# Altium footprint library PCBLIB.PcbLib: 775 footprints (part 32 of 49)
Each footprint in its own frame and in the unit in brackets; x right, y up, seen from the top. Pads: shape width x height; smd on the part's side, far side on the other; paste and mask are expansions set on the pad; w line width, h text height; cw(c..) or ccw(c..) is an arc to the next point about the centre after c.
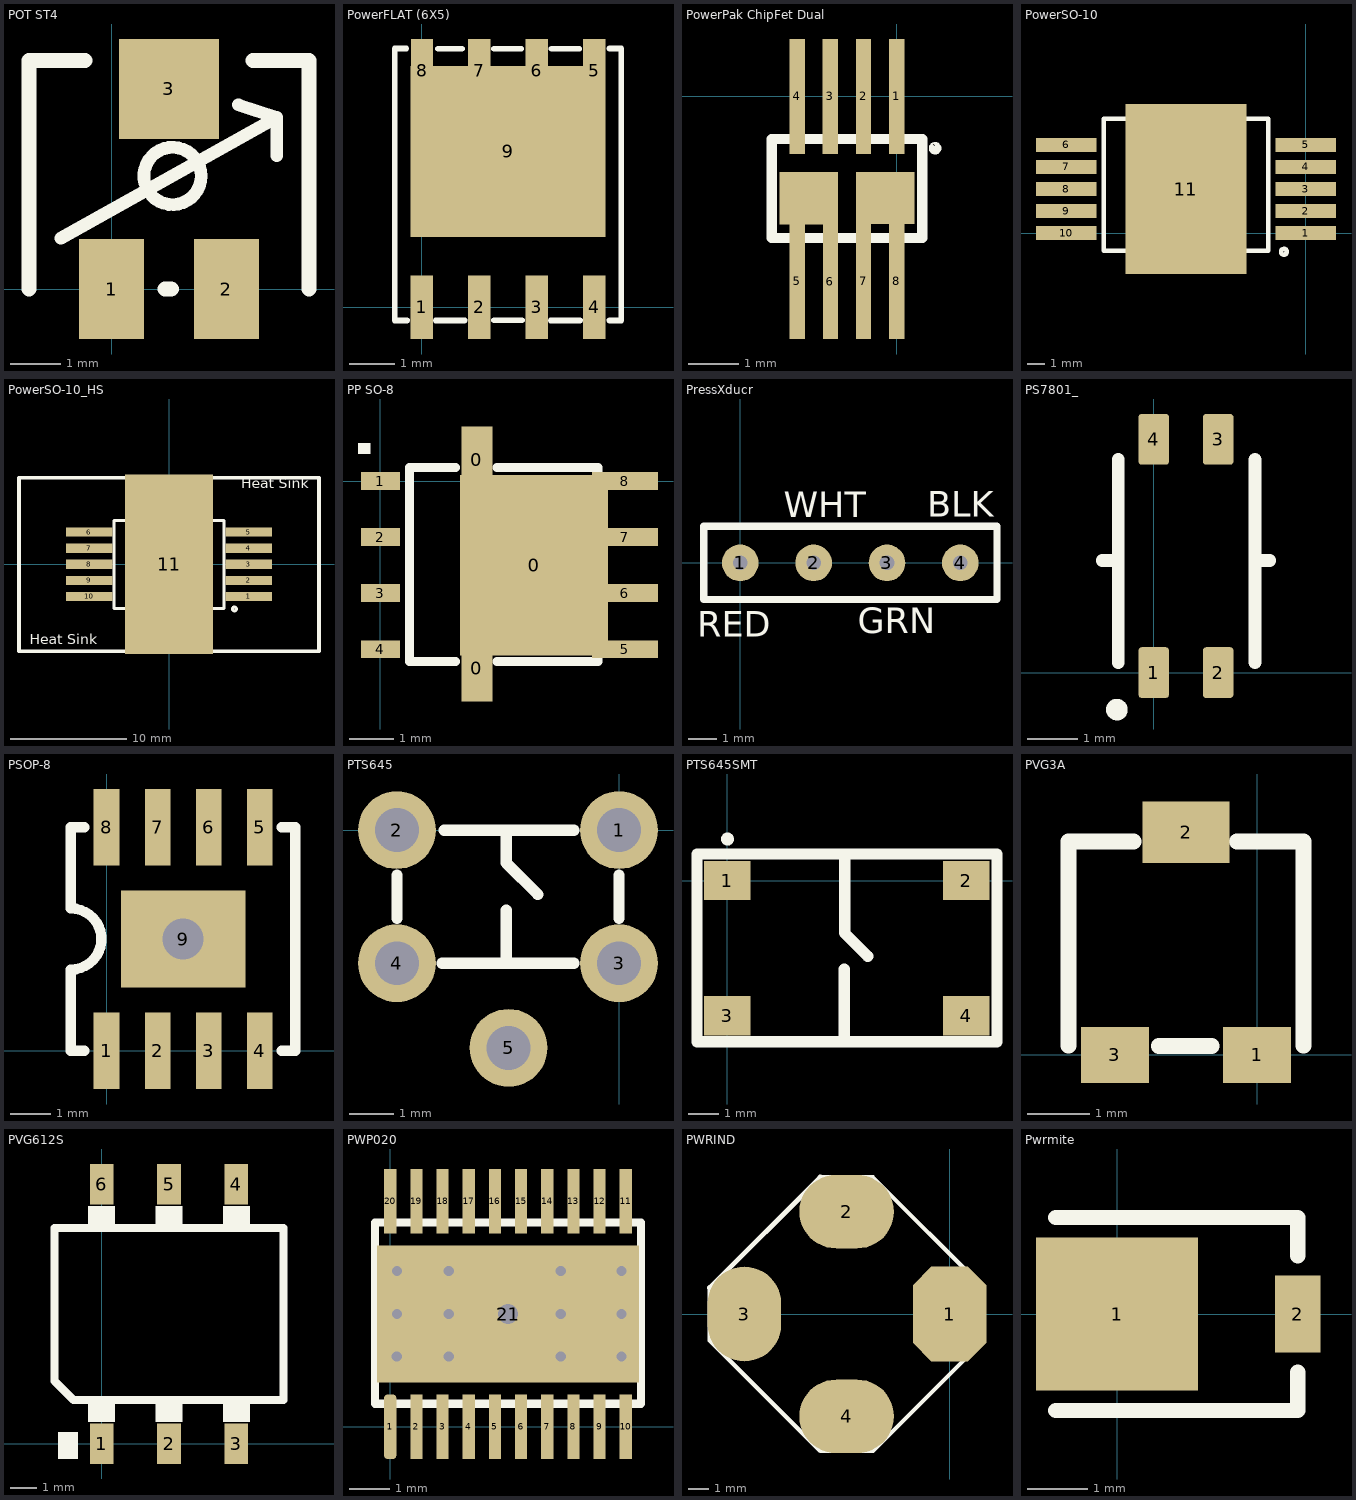
[diagram p31: the footprints below, top view; thin cyan lines are the x and y axes]

## POT ST4 [mm]
pads (3):
  rect 1.3x2 smd: 1(0,0) 2(2.299,0)
  rect 2x2 smd: 3(1.149,4)
TopOverlay:
  circle w0.254: c1.219,2.261 r0.573
  lines w0.254: -1.016,1.016 3.302,3.429 ; 2.54,3.683 3.302,3.429 ; 3.302,2.667 3.302,3.429
  lines w0.305: -1.651,0 -1.651,4.572 -0.533,4.572 ; 1.067,0 1.194,0 ; 2.832,4.572 3.95,4.572 3.95,0
Mechanical4:
  text ".040" at 0,0 h0.03

## PowerFLAT (6X5) [mm]
height 0.93
pads (9):
  rect 0.495x1.4 smd: 1(0,0) 2(1.27,0) 3(2.54,0) 4(3.81,0) 5(3.81,5.221) 6(2.54,5.221) 7(1.27,5.221) 8(0.008,5.221)
  rect 4.305x3.78 smd: 9(1.905,3.44)
TopOverlay:
  lines w0.127: -0.34,5.711 -0.595,5.711 -0.595,-0.289 -0.324,-0.289 -0.322,-0.288 ; 0.312,-0.289 0.947,-0.289 0.949,-0.288 ; 0.358,5.706 0.889,5.706 0.891,5.704 ; 1.596,-0.288 2.211,-0.288 ; 1.596,5.706 2.2,5.706 ; 2.851,-0.289 3.494,-0.289 3.495,-0.288 ; 2.866,5.704 3.476,5.704 3.477,5.706 ; 4.143,5.709 4.145,5.711 4.405,5.711 4.405,-0.289 4.148,-0.289 4.147,-0.288

## PowerPak ChipFet Dual [mil]
pads (11):
  rect 12x90 smd: 1(0,0) 2(-26.11,0) 3(-52.11,0) 4(-78.12,0) 5(-78,-145.1) 6(-52.08,-145.28) 7(-26.07,-145.1) 8(-0.06,-145.1)
  round 10 on Top Overlay: `(30.06,-40.68)
  rect 46x41 smd: ""(-69.05,-79.9) ""(-9.06,-79.72)
TopOverlay:
  lines w8: -98.05,-111.18 19.95,-111.18 19.95,-33.32 -98.05,-33.32 -98.05,-111.18

## PowerSO-10 [mm]
pads (11):
  rect 3.5x0.79 smd: 1(0,0) 2(0,1.27) 3(0,2.54) 4(0,3.81) 5(0,5.08) 6(-13.8,5.08) 7(-13.8,3.81) 8(-13.8,2.54) 9(-13.8,1.27) 10(-13.8,0)
  rect 7x9.8 smd: 11(-6.9,2.54)
TopOverlay:
  circle w0.254: c-1.253,-1.079 r0.168
  lines w0.254: -7.65,-1.02 -11.65,-1.02 -11.65,6.58 -2.15,6.58 -2.15,-1.02 -6.15,-1.02 ccw(c-6.885,-0.857) -7.628,-0.98

## PowerSO-10_HS [mm]
pads (11):
  rect 4x0.79 smd: 1(6.9,-2.78) 2(6.9,-1.39) 3(6.9,0) 4(6.9,1.39) 5(6.9,2.78) 6(-6.9,2.78) 7(-6.9,1.39) 8(-6.9,0) 9(-6.9,-1.39) 10(-6.9,-2.78)
  rect 7.62x15.494 smd: 11(0,0)
TopOverlay:
  circle w0.254: c5.647,-3.859 r0.168
  lines w0.254: -0.75,-3.8 -4.75,-3.8 -4.75,3.8 4.75,3.8 4.75,-3.8 0.75,-3.8 ccw(c0.015,-3.637) -0.728,-3.76
  lines w0.305: -12.954,-7.493 -12.954,7.493 12.954,7.493 12.954,-7.493 -12.954,-7.493
  text "Heat Sink" at 6.223,6.274 h1.52
  text "Heat Sink" at -12.04,-7.214 h1.52

## PP SO-8 [mil]
pads (11):
  rect 27.56x59.06 smd: 0(86,-167) 0(86,19)
  rect 132x161 smd: 0(137,-75)
  rect 35x16 smd: 1(0,0) 2(0,-50) 3(0,-100) 4(0,-150)
  rect 59.06x16 smd: 5(218,-150) 6(218,-100) 7(218,-50) 8(218,0)
TopOverlay:
  rectangle: -20,24 -9,34
  lines w8: 67,-161 26,-161 26,12 67,12 ; 104,-161 194,-161 194,12 ; 104,12 194,12 ; 194,-160 194,-151 194,12

## PressXducr [mil]
pads (4):
  round 50 hole 20: 1(0,0) 2(100,0) 3(200,0) 4(300,0)
TopOverlay:
  lines w10: -50,-50 -50,50 350,50 350,-50 -50,-50
  text "BLK" at 255,63 h35
  text "WHT" at 59,62 h35
  text "GRN" at 160,-96 h35
  text "RED" at -59,-101 h35

## PS7801_ [mm]
pads (4):
  rrect20% 0.6x1 smd: 1(0,0) 2(1.27,0) 3(1.27,4.6) 4(0,4.6)
TopOverlay:
  circle w0.254: c-0.727,-0.73 r0.087
  lines w0.254: -1.015,2.212 -0.7,2.212 ; -0.7,0.2 -0.7,4.2 ; 2,0.2 2,4.2 ; 2,2.212 2.287,2.212

## PSOP-8 [mil]
height 58
pads (9):
  rect 25x75 smd: 1(0,0) 2(50,0) 3(100,0) 4(150,0) 5(150,219) 6(100,219) 7(50,219) 8(0,219)
  rect 122x95 / inner round 60 / far side round 60 hole 40: 9(75,109.5)
TopOverlay:
  lines w10: -21.5,0 -35,0 -35,79.5 ccw(c-35,109.5) -35,139.5 -35,219 -21.5,219 ; 171.5,0 185,0 185,219 171.5,219
Mechanical4:
  text ".040" at 48.61,9 h1

## PTS645 [mil]
pads (5):
  round 69 hole 39: 1(0,0) 2(-197,0) 3(0,-118) 4(-197,-118) 5(-98,-193)
TopOverlay:
  lines w10: -197,-78 -197,-40 ; -157,-118 -40,-118 ; -155,0 -40,0 ; -100,-118 -100,-71 ; -100,0 -100,-29 -72,-57 ; 0,-78 0,-40
  text "." at -4,52 h50

## PTS645SMT [mm]
pads (4):
  rect 1.55x1.3 smd: 1(0,0) 2(7.95,0) 3(0,-4.5) 4(7.95,-4.5)
TopOverlay:
  circle w0.254: c0.007,1.382 r0.087
  lines w0.381: 3.896,-5.351 3.896,-2.947 ; 3.905,0.884 3.905,-1.651 3.905,-1.746 4.682,-2.524 ; 8.963,-5.36 -1.008,-5.36 -1.008,0.884 8.979,0.884 8.979,-5.36

## PVG3A [mm] "Potentiometers"
height 2
pads (3):
  rect 1.1x0.9 smd: 1(0,0) 3(-2.3,0)
  rect 1.4x1 smd: 2(-1.15,3.6)
TopOverlay:
  lines w0.254: -3.051,0.15 -3.051,3.45 -1.998,3.45 ; -1.589,0.146 -0.733,0.146 ; -0.324,3.45 0.751,3.45 0.751,0.15

## PVG612S [mil] "Solid State Relay"
height 135
pads (6):
  rect 35x60 smd: 1(0,0) 2(100,0) 3(200,0) 4(200,385) 5(100,385) 6(0,385)
TopOverlay:
  region: -35,-22.5 -35,17.5 -65,17.5 -65,-22.5
  region: 20,62.5 -20,62.5 -20,32.5 20,32.5
  region: 120,62.5 80,62.5 80,32.5 120,32.5
  region: 220,62.5 180,62.5 180,32.5 220,32.5
  region: 20,352.5 -20,352.5 -20,322.5 20,322.5
  region: 120,352.5 80,352.5 80,322.5 120,322.5
  region: 220,352.5 180,352.5 180,322.5 220,322.5
  lines w12: -70,320 270,320 270,65 -41.63,64.94 -69.95,93.25 -70,320

## PWP020 [mm]
height 1.2
pads (21):
  rrect50% 0.3x1.6 smd: 1(0,0)
  rect 0.3x1.6 smd: 2(0.65,0) 3(1.3,0) 4(1.95,0) 5(2.6,0) 6(3.25,0) 7(3.9,0) 8(4.55,0) 9(5.2,0) 10(5.85,0) 11(5.85,5.6) 12(5.2,5.6) 13(4.55,5.6) 14(3.9,5.6) 15(3.25,5.6) 16(2.6,5.6) 17(1.95,5.6) 18(1.3,5.6) 19(0.65,5.6) 20(0,5.6)
  rect 6.5x3.4 smd: 21(2.925,2.8)
via 0.171,3.869 diameter 0.635 hole 0.254
via 0.171,2.8 diameter 0.635 hole 0.254
via 1.453,3.869 diameter 0.635 hole 0.254
via 1.453,2.8 diameter 0.635 hole 0.254
via 1.453,1.744 diameter 0.635 hole 0.254
via 4.238,3.869 diameter 0.635 hole 0.254
via 4.238,2.8 diameter 0.635 hole 0.254
via 4.238,1.744 diameter 0.635 hole 0.254
via 5.741,3.869 diameter 0.635 hole 0.254
via 5.741,2.8 diameter 0.635 hole 0.254
via 5.741,1.744 diameter 0.635 hole 0.254
via 2.925,2.8 diameter 1.016 hole 0.508
via 0.163,1.744 diameter 0.635 hole 0.254
TopOverlay:
  lines w0.203: 6.225,0.571 -0.375,0.571 -0.375,5.071 6.225,5.071 6.225,0.571 ; 6.225,0.571 6.225,0.571
  text "." at -1.065,-0.878 h7.62

## PWRIND [mil]
pads (4):
  oct 140x180 smd: 1(0,0)
  oval 180x140 smd: 2(-195.86,194.63) 4(-195.86,-194.28)
  oval 140x180 smd: 3(-390.31,0.17)
TopOverlay:
  lines w8: -456,50 -456,-50 -246,-260 -146,-260 64,-50 64,50 -146,260 -246,260
  lines w10: -456,50 -246,260
  text "." at 80,0 h60

## Pwrmite [mil]
pads (2):
  rect 106x100 smd: 1(0,0)
  rect 30x50 smd: 2(118,0)
TopOverlay:
  lines w10: -40,-63 118,-63 118,-38 ; -40,63 118,63 118,38
Mechanical4:
  text ".065" at 0,0 h1